# Altium footprint library standard.PcbLib: 227 footprints (part 9 of 15)
Each footprint in its own frame and in the unit in brackets; x right, y up, seen from the top. Pads: shape width x height; smd on the part's side, far side on the other; paste and mask are expansions set on the pad; w line width, h text height; cw(c..) or ccw(c..) is an arc to the next point about the centre after c.
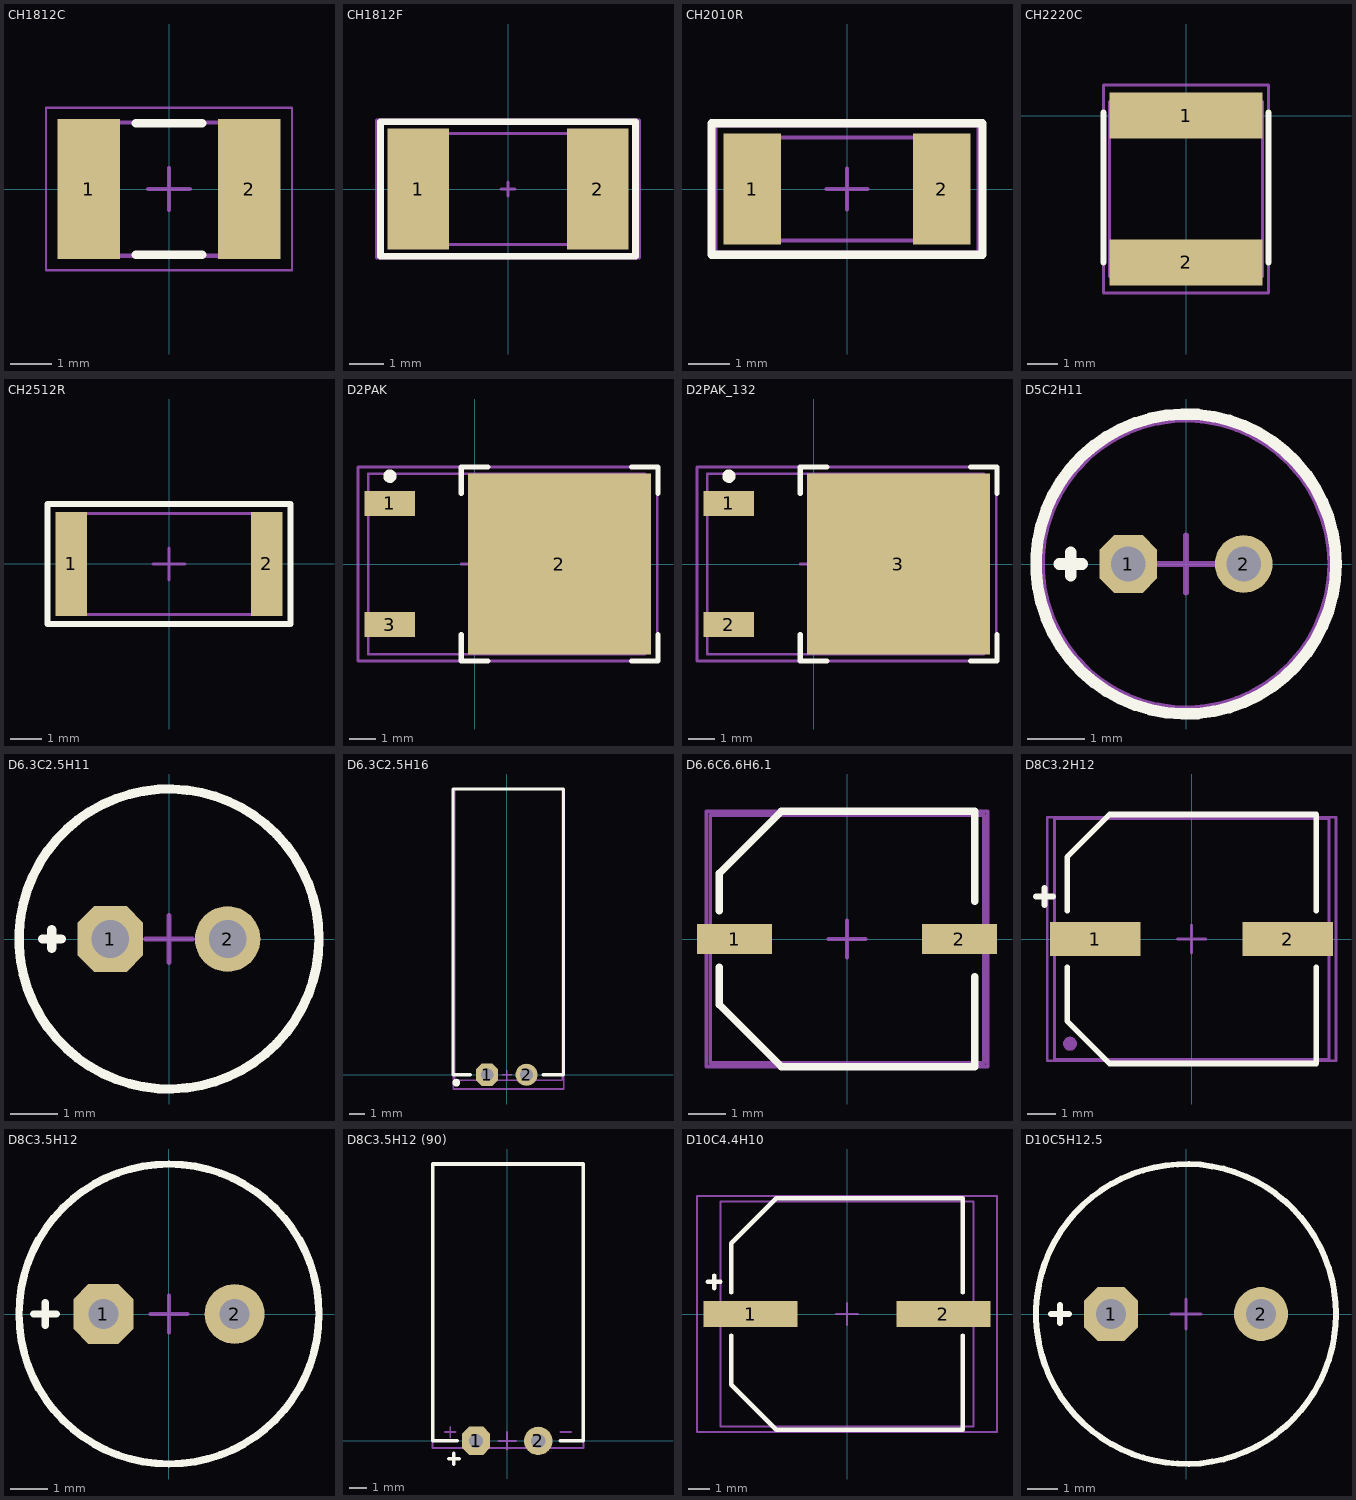
[diagram p8: the footprints below, top view; thin cyan lines are the x and y axes]

## CH1812C [mm]
height 1.4
pads (2):
  rect 1.5x3.35 smd: 1(-1.925,0) 2(1.925,0)
Top Overlay:
  lines w0.2: -0.8,-1.575 0.8,-1.575 ; -0.8,1.575 0.8,1.575
Mechanical 1:
  lines w0.1: -2.25,-1.6 -2.25,1.6 2.25,1.6 2.25,-1.6 -2.25,-1.6
Mechanical 15:
  lines w0.05: -2.95,-1.95 -2.95,1.95 2.95,1.95 2.95,-1.95 -2.95,-1.95
  lines w0.1: -0.5,0 0.5,0 ; 0,-0.5 0,0.5
3D body "SW3dPS-1812 SMD Capacitor.STEP": height 1.6, standoff 0, extent -2.25,-1.6 2.25,1.6

## CH1812F [mm] "Chip Fuse, 1812"
height 0.6
pads (2):
  rect 1.78x3.5 smd: 1(-2.6,0) 2(2.6,0)
Top Overlay:
  lines w0.2: -3.7,-1.95 3.7,-1.95 3.7,1.95 -3.7,1.95 -3.7,-1.95
Mechanical 1:
  lines w0.1: -2.41,-1.61 -2.41,1.61 2.41,1.61 2.41,-1.61 -2.41,-1.61
Mechanical 15:
  lines w0.1: -0.2,0 0.2,0 ; 0,-0.2 0,0.2 ; -3.8,-2 -3.8,2 3.8,2 3.8,-2 -3.7,-2 -3.8,-2
3D body "User Library-fuse1812.step": height 1.32, standoff 0, extent -2.41,-1.61 2.41,1.61

## CH2010R [mm]
height 0.55
pads (2):
  rect 1.4x2.7 smd: 1(-2.3,0) 2(2.3,0)
Top Overlay:
  lines w0.2: -3.3,-1.6 -3.3,1.6 3.3,1.6 3.3,-1.6 -3.3,-1.6
Mechanical 1:
  lines w0.1: -2.5,-1.25 -2.5,1.25 2.5,1.25 2.5,-1.25 -2.5,-1.25
Mechanical 15:
  lines w0.1: -0.5,0 0.5,0 ; 0,-0.5 0,0.5 ; -3.2,-1.55 -3.2,1.55 3.2,1.55 3.2,-1.55 -3.2,-1.55
3D body "User Library-R_2010.STEP": height 0.6, standoff 0, extent -2.5,-1.25 2.5,1.25

## CH2220C [mm]
pads (2):
  rect 5x1.5 smd: 1(0,0) 2(0,-4.8)
Top Overlay:
  lines w0.2: -2.7,-4.8 -2.7,0.1 ; 2.7,-4.8 2.7,0.1
Mechanical 1:
  lines w0.1: -2.5,-5.25 -2.5,0.45 2.5,0.45 2.5,-5.25 -2.5,-5.25
Mechanical 15:
  lines w0.1: -2.7,-5.8 2.7,-5.8 2.7,1 -2,1 -2.7,1 -2.7,-5.8
3D body "User Library-CAPC5750X23.STEP": height 2.3, standoff 0, extent -2.5,-5.25 2.5,0.45

## CH2512R [mm]
height 0.55
pads (2):
  rect 1x3.3 smd: 1(-3.1,0) 2(3.1,0)
Top Overlay:
  lines w0.2: -3.85,-1.9 -3.85,1.9 3.85,1.9 3.85,-1.9 -3.85,-1.9
Mechanical 1:
  lines w0.1: -3.175,-1.6 -3.175,1.6 3.175,1.6 3.175,-1.6 -3.175,-1.6
Mechanical 15:
  lines w0.1: -0.5,0 0.5,0 ; 0,-0.5 0,0.5 ; -3.85,-1.9 3.85,-1.9 3.85,1.9 -3.85,1.9 -3.85,-1.9
3D body "chip_2512_r.STEP": height 0.52, standoff -0.04, extent -3.175,-1.6 3.175,1.6

## D2PAK [mm] "D-PAK, 3-Pads, Body 6,2x6,7mm (max), IPC Medium Density"
height 2.38
pads (3):
  rect 1.9x0.95 smd: 1(-3.191,2.28) 3(-3.191,-2.28)
  rect 6.9x6.8 smd: 2(3.191,0)
Top Overlay:
  circle w0.25: c-3.191,3.305 r0.125
  lines w0.2: -0.5,-2.65 -0.5,-3.65 0.5,-3.65 ; -0.5,2.65 -0.5,3.65 0.5,3.65 ; 5.9,-3.65 6.9,-3.65 6.9,-2.65 ; 5.9,3.65 6.9,3.65 6.9,2.65
Mechanical 1:
  lines w0.1: -4,-3.4 6.4,-3.4 6.4,3.4 -4,3.4 -4,-3.4
Mechanical 15:
  lines w0.1: -0.5,0 0.5,0 ; 0,-0.5 0,0.5 ; -4.391,-3.65 6.874,-3.65 6.874,3.65 -4.391,3.65 -4.391,-3.65
3D body "D2PAK.step": height 2.39, standoff 0, extent -4.019,-3.365 6.428,3.365

## D2PAK_132 [mm] "D-PAK, 3-Pads, Body 6,2x6,7mm (max), IPC Medium Density"
height 2.38
pads (3):
  rect 1.9x0.95 smd: 1(-3.191,2.28) 2(-3.191,-2.28)
  rect 6.9x6.8 smd: 3(3.191,0)
Top Overlay:
  circle w0.25: c-3.191,3.305 r0.125
  lines w0.2: -0.5,-2.65 -0.5,-3.65 0.5,-3.65 ; -0.5,2.65 -0.5,3.65 0.5,3.65 ; 5.9,-3.65 6.9,-3.65 6.9,-2.65 ; 5.9,3.65 6.9,3.65 6.9,2.65
Mechanical 1:
  lines w0.1: -4,-3.4 6.4,-3.4 6.4,3.4 -4,3.4 -4,-3.4
Mechanical 15:
  lines w0.1: -0.5,0 0.5,0 ; 0,-0.5 0,0.5 ; -4.391,-3.65 6.874,-3.65 6.874,3.65 -4.391,3.65 -4.391,-3.65
3D body "D2PAK.step": height 2.39, standoff 0, extent -4.019,-3.365 6.428,3.365

## D5C2H11 [mm] "Polar capacitor, diameter 5 mm, leads clearance 2 mm, height 11 mm"
height 11
pads (2):
  oct 1x1 hole 0.6: 1(-1,0)
  round 1 hole 0.6: 2(1,0)
Top Overlay:
  circle w0.2: c0,0 r2.6
  lines w0.2: -2.2,0 -1.8,0 ; -2,-0.2 -2,0.2
Mechanical 1:
  circle w0.1: c0,0 r2.5
Mechanical 15:
  circle w0.1: c0,0 r2.6
  lines w0.1: -0.5,0 0.5,0 ; 0,-0.5 0,0.5
3D body "User Library-CapAluRadial_D50H110.STEP": height 13.5, standoff -3, extent -2.75,-2.75 2.75,2.75

## D6.3C2.5H11 [mm] "Polar capacitor, diameter 6.3 mm, leads clearance 2.5 mm, height 11 mm"
height 11
pads (2):
  oct 1.4x1.4 hole 0.8: 1(-1.25,0)
  round 1.4 hole 0.8: 2(1.25,0)
Top Overlay:
  circle w0.2: c0,0 r3.2
  lines w0.2: -2.7,0 -2.3,0 ; -2.5,-0.2 -2.5,0.2
Mechanical 1:
  circle w0.1: c0,0 r3.2
Mechanical 15:
  circle w0.1: c0,0 r3.2
  lines w0.1: -0.5,0 0.5,0 ; 0,-0.5 0,0.5
3D body "User Library-CapAluRadial_D63H110.STEP": height 12.5, standoff -3, extent -3.4,-3.399 3.4,3.399

## D6.3C2.5H16 [mm] "Polar capacitor, diameter 6.3 mm, leads clearance 2.5 mm, height 11 mm"
height 16
pads (3):
  oct 1.4x1.4 hole 0.8: 1(-1.25,0)
  round 1.4 hole 0.8: 2(1.25,0)
  round 0.5 on Top Overlay: ""(-3.2,-0.5)
Top Overlay:
  lines w0.2: -2.3,0 -3.4,0 -3.4,18.1 3.6,18.1 3.6,0 2.3,0
Mechanical 13:
  lines w0.1: -3.3,-0.334 -3.3,18.1 3.5,18.1 3.5,-0.334 -3.3,-0.334
Mechanical 15:
  lines w0.1: -0.3,0 0.3,0 ; 0,-0.3 0,0.3 ; -3.4,-0.9 3.6,-0.9 3.6,18.1 -3.4,18.1 -3.4,-0.9
3D body "D63H150.STEP": height 6.8, standoff -1.6, extent -3.3,-0.334 3.5,18.1

## D6.6C6.6H6.1 [mm]
height 6.1
pads (2):
  rect 2x0.8 smd: 1(-3,0) 2(3,0)
Top Overlay:
  lines w0.2: -3.4,-0.75 -3.4,-1.75 -1.75,-3.4 3.4,-3.4 3.4,-1 ; -3.4,0.75 -3.4,1.75 -1.75,3.4 3.4,3.4 3.4,1
Mechanical 1:
  lines w0.1: -3.65,-3.3 -3.65,3.3 3.65,3.3 3.65,-3.3 -3.65,-3.3
Mechanical 13:
  lines w0.1: -3,0 -2.6,0 ; -2.8,-0.2 -2.8,0.2
Mechanical 15:
  lines w0.1: -0.5,0 0.5,0 ; 0,-0.5 0,0.5 ; -3.75,-3.4 -3.75,3.4 3.75,3.4 3.75,-3.4 -3.75,-3.4
3D body "User Library-SMD Polymer Aluminum Electrolytic Capacitors C6 82uF 6,3V.STEP": height 5.85, standoff -0.1, extent -3.65,-3.3 3.65,3.3

## D8C3.2H12 [mm]
height 10.3
pads (3):
  rect 3.2x1.2 smd: 1(-3.4,0) 2(3.4,0)
  round 0.5 on Mech1: ""(-4.3,-3.7)
Top Overlay:
  lines w0.2: -5.5,1.5 -4.9,1.5 ; -5.2,1.2 -5.2,1.8 ; -4.4,-1 -4.4,-2.9 -2.9,-4.4 4.4,-4.4 4.4,-1 ; -4.4,1 -4.4,2.9 -2.9,4.4 4.4,4.4 4.4,1
Mechanical 1:
  lines w0.1: -4.852,-4.25 4.848,-4.25 4.848,4.25 -4.852,4.25 -4.852,-4.25
Mechanical 15:
  lines w0.1: -0.5,0 0.5,0 ; 0,-0.5 0,0.5 ; -5.1,-4.3 -5.1,4.3 5.1,4.3 5.1,-4.3 -5.1,-4.3
3D body "User Library-AL_EL_cap_8mmx10mm.STEP": height 10.5, standoff 0, extent -4.852,-4.25 4.848,4.25

## D8C3.5H12 [mm] "Polar capacitor, diameter 8 mm, leads clearance 3.5 mm, height 12 mm"
height 12
pads (2):
  oct 1.6x1.6 hole 0.8: 1(-1.75,0)
  round 1.6 hole 0.8: 2(1.75,0)
Top Overlay:
  circle w0.2: c0,0 r4
  lines w0.2: -3.6,0 -3,0 ; -3.3,-0.3 -3.3,0.3
Mechanical 1:
  circle w0.1: c0,0 r4
Mechanical 15:
  circle w0.1: c0,0 r4
  lines w0.1: -0.5,0 0.5,0 ; 0,-0.5 0,0.5
3D body "User Library-CapAluRadial_D80H115.STEP": height 13, standoff -3, extent -4.25,-4.247 4.25,4.247

## D8C3.5H12 (90) [mm] "Polar capacitor, diameter 8 mm, leads clearance 3.5 mm, height 12 mm"
height 12
pads (2):
  oct 1.6x1.6 hole 0.8: 1(-1.75,0)
  round 1.6 hole 0.8: 2(1.75,0)
Top Overlay:
  lines w0.2: -3.3,-1 -2.7,-1 ; -3,-1.3 -3,-0.7 ; -2.8,0 -4.2,0 -4.2,15.6 4.3,15.6 4.3,0 3,0
Mechanical 1:
  lines w0.1: -3.5,0.5 -2.9,0.5 ; -3.2,0.2 -3.2,0.8 ; 3,0.5 3.6,0.5 ; -4.2,-0.4 4.3,-0.4 4.3,15.6 -4.2,15.6 -4.2,-0.4
Mechanical 15:
  lines w0.1: -0.5,0 0.5,0 ; 0,-0.5 0,0.5
3D body "User Library-CapAluRadial_D80H115.STEP": height 8.55, standoff 0.05, extent -4.2,-0.4 4.3,15.6

## D10C4.4H10 [mm]
height 10.3
pads (2):
  rect 4.4x1.2 smd: 1(-4.5,0) 2(4.5,0)
Top Overlay:
  lines w0.2: -6.5,1.5 -5.9,1.5 ; -6.2,1.2 -6.2,1.8 ; -5.4,-1 -5.4,-3.2 -5.4,-3.3 -3.3,-5.4 5.4,-5.4 5.4,-1 ; -5.4,1 -5.4,3.2 -5.4,3.3 -3.3,5.4 5.4,5.4 5.4,1
Mechanical 1:
  lines w0.1: -5,0 -4,0 ; -4.5,-0.5 -4.5,0.5 ; -5.901,-5.25 5.899,-5.25 5.899,5.25 -5.901,5.25 -5.901,-5.25
Mechanical 15:
  lines w0.1: -0.5,0 0.5,0 ; 0,-0.5 0,0.5 ; -7,-5.5 6.5,-5.5 7,-5.5 7,5.5 -7,5.5 -7,-5.5
3D body "User Library-cap_10x10x10-1.STEP": height 10.5, standoff 0, extent -5.901,-5.25 5.899,5.25

## D10C5H12.5 [mm] "Polar capacitor, diameter 10 mm, leads clearance 5 mm, height 12.5 mm"
height 12.5
pads (2):
  oct 1.8x1.8 hole 1: 1(-2.5,0)
  round 1.8 hole 1: 2(2.5,0)
Top Overlay:
  circle w0.2: c0,0 r5
  lines w0.2: -4.5,0 -3.9,0 ; -4.2,-0.3 -4.2,0.3
Mechanical 1:
  circle w0.1: c0,0 r5
Mechanical 15:
  circle w0.1: c0,0 r5
  lines w0.1: -0.5,0 0.5,0 ; 0,-0.5 0,0.5
3D body "User Library-CapAluRadial_D100H125.STEP": height 14, standoff -3, extent -5.25,-5.249 5.25,5.249